# Altium footprint library myPCBLib.PcbLib: 113 footprints (part 2 of 8)
Each footprint in its own frame and in the unit in brackets; x right, y up, seen from the top. Pads: shape width x height; smd on the part's side, far side on the other; paste and mask are expansions set on the pad; w line width, h text height; cw(c..) or ccw(c..) is an arc to the next point about the centre after c.
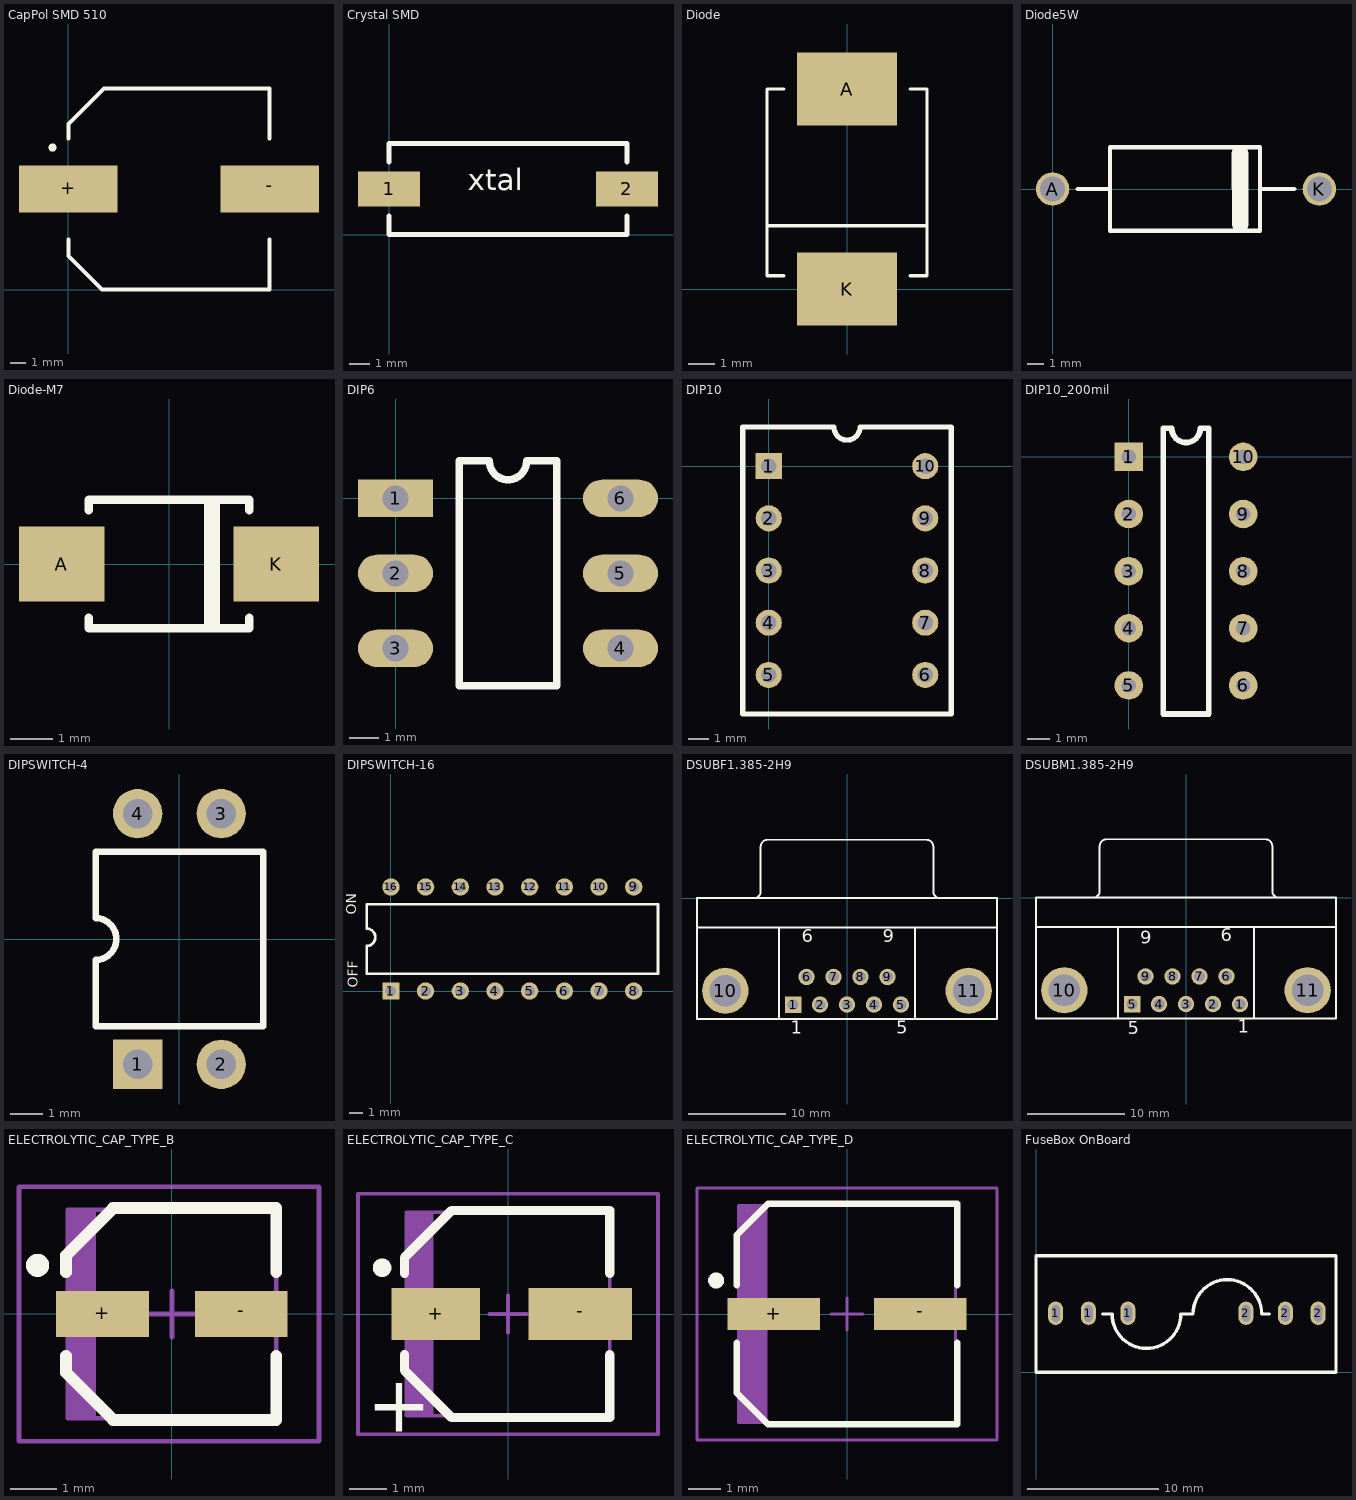
[diagram p1: the footprints below, top view; thin cyan lines are the x and y axes]

## CapPol SMD 510 [mil]
pads (2):
  rect 250x120 smd: +(0,255) -(510,255)
Top Overlay:
  circle w10: c-40,360 r5
  lines w10: 0,127.5 0,85 85,0 510,0 510,127.5 ; 0,382.5 0,420 90,510 510,510 510,382.5

## Crystal SMD [mm]
pads (2):
  rect 3x1.7 smd: 1(0,2.2) 2(11.5,2.2)
Top Overlay:
  lines w0.254: 0,0.9 0,0 11.5,0 11.5,0.9 ; 0,3.5 0,4.4 11.5,4.4 11.5,3.5
  text "xtal" at 3.8,1.8 h1.78

## Diode [mil]
pads (2):
  rect 150x110 smd: A(0,300) K(0,0)
Top Overlay:
  lines w1: -120,20 -120,300 ; 120,20 120,300
  lines w5: -120,95 120,95 ; -95,20 -120,20 -120,300 -95,300 ; 95,20 120,20 120,300 95,300

## Diode5W [mm]
pads (2):
  round 2 hole 1.5: A(0,0) K(16,0)
Top Overlay:
  lines w0.254: 1.5,0 3.437,0 ; 12.437,0 14.5,0 ; 3.437,0 3.437,-2.5 12.437,-2.5 12.437,2.5 3.437,2.5 3.437,0
  lines w1: 11.238,2.1 11.251,-2.1

## Diode-M7 [mil]
pads (2):
  rect 80x70 smd: A(-100,0) K(100,0)
Top Overlay:
  lines w7.87: -75,-60 75,-60 ; -75,60 75,60
  lines w8: -75,-60 -75,-50 ; -75,50 -75,60 ; 75,-60 75,-50 ; 75,50 75,60
  lines w15: 40,-55 40,55

## DIP6 [mil]
pads (6):
  rect 100x50 hole 35: 1(0,0)
  oval 100x50 hole 35: 2(0,-100) 3(0,-200) 4(300,-200) 5(300,-100) 6(300,0)
Top Overlay:
  lines w10: 85,-250 215,-250 215,50 175,50 cw(c150,50) 125,50 85,50 85,-250

## DIP10 [mil]
pads (10):
  rect 50x50 hole 30: 1(0,0)
  round 50 hole 30: 2(0,-100) 3(0,-200) 4(0,-300) 5(0,-400) 6(300,-400) 7(300,-300) 8(300,-200) 9(300,-100) 10(300,0)
Top Overlay:
  lines w10: -50,-475 350,-475 350,75 175,75 cw(c150,75) 125,75 -50,75 -50,-475

## DIP10_200mil [mil]
pads (10):
  rect 50x50 hole 25: 1(0,0)
  round 50 hole 25: 2(0,-100) 3(0,-200) 4(0,-300) 5(0,-400) 6(200,-400) 7(200,-300) 8(200,-200) 9(200,-100) 10(200,0)
Top Overlay:
  lines w10: 60,-450 140,-450 140,50 125,50 cw(c100,50) 75,50 60,50 60,-450

## DIPSWITCH-4 [mm]
pads (4):
  rect 1.5x1.5 hole 0.9: 1(-1.27,-3.81)
  round 1.5 hole 0.9: 2(1.27,-3.81) 3(1.27,3.81) 4(-1.27,3.81)
Top Overlay:
  lines w0.2: -2.55,-2.65 -2.55,-0.635 ccw(c-2.55,0) -2.55,0.635 -2.55,2.65 2.55,2.65 2.55,-2.65 -2.55,-2.65
3D body: height 6.3, standoff -4, extent -3.032,-4.8 3.048,4.8

## DIPSWITCH-16 [mil]
pads (16):
  rect 50x50 hole 30: 1(0,0)
  round 50 hole 30: 2(100,0) 3(200,0) 4(300,0) 5(400,0) 6(500,0) 7(600,0) 8(700,0) 9(700,300) 10(600,300) 11(500,300) 12(400,300) 13(300,300) 14(200,300) 15(100,300) 16(0,300)
Top Overlay:
  lines w7.87: -70,50 770,50 770,250 -70,250 -70,180 cw(c-70,155) -70,130 -70,50
  text "ON" at -90,220 h50
  text "OFF" at -85,10 h50
3D body: height 248.03, standoff -157.48, extent -70,-43.98 769.37,333.98

## DSUBF1.385-2H9 [mm]
pads (11):
  rect 1.69x1.69 hole 1.09: 1(-5.54,-10.92)
  round 1.69 hole 1.09: 2(-2.77,-10.92) 3(0,-10.92) 4(2.77,-10.92) 5(5.54,-10.92) 6(-4.155,-8.08) 7(-1.385,-8.08) 8(1.385,-8.08) 9(4.155,-8.08)
  round 4.76 hole 3.26: 10(-12.495,-9.5) 11(12.495,-9.5)
Top Overlay:
  lines w0.2: -15.4,-3 15.4,-3 ; -9.56,0.005 ccw(c-9.56,0.7) -8.865,0.7 -8.865,5.3 ; -8.86,5.305 cw(c-8.165,5.305) -8.165,6 8.165,6 cw(c8.165,5.305) 8.86,5.305 ; -7,-12.4 -7,-3 ; 7,-12.4 7,-3 ; 8.865,5.3 8.865,0.7 ccw(c9.56,0.7) 9.56,0.005 ; -15.4,-12.4 15.4,-12.4 15.4,0 -15.4,0 -15.4,-12.4
  text "6" at -4.655,-4.975 h2.29
  text "9" at 3.655,-4.975 h2.29
  text "5" at 5.04,-14.375 h2.29
  text "1" at -5.79,-14.375 h2.29
3D body: height 12.62, standoff -4.25, extent -15.443,-12.458 15.367,5.842

## DSUBM1.385-2H9 [mm]
pads (11):
  round 1.69 hole 1.09: 1(5.54,-10.92) 2(2.77,-10.92) 3(0,-10.92) 4(-2.77,-10.92) 6(4.155,-8.08) 7(1.385,-8.08) 8(-1.385,-8.08) 9(-4.155,-8.08)
  rect 1.69x1.69 hole 1.09: 5(-5.54,-10.92)
  round 4.76 hole 3.26: 10(-12.495,-9.5) 11(12.495,-9.5)
Top Overlay:
  lines w0.2: -15.4,-3 15.4,-3 ; -9.56,0.005 ccw(c-9.56,0.7) -8.865,0.7 -8.865,5.3 ; -8.86,5.305 cw(c-8.165,5.305) -8.165,6 8.165,6 cw(c8.165,5.305) 8.86,5.305 ; -7,-12.4 -7,-3 ; 7,-12.4 7,-3 ; 8.865,5.3 8.865,0.7 ccw(c9.56,0.7) 9.56,0.005 ; -15.4,-12.4 15.4,-12.4 15.4,0 -15.4,0 -15.4,-12.4
  text "6" at 3.556,-4.953 h2.29
  text "9" at -4.699,-5.207 h2.29
  text "5" at -5.969,-14.478 h2.29
  text "1" at 5.334,-14.351 h2.29
3D body: height 12.62, standoff -4.25, extent -15.494,-12.319 15.316,6.281

## ELECTROLYTIC_CAP_TYPE_B [mm]
pads (2):
  rect 2x1 smd: +(-1.5,0) -(1.5,0)
Top Overlay:
  circle w0.25: c-2.9,1.05 r0.125
  lines w0.254: -2.286,-0.9 -2.286,-1.27 -1.27,-2.286 2.25,-2.286 ; -2.286,0.9 -2.286,1.27 -1.27,2.286 2.25,2.286 2.25,0.9 ; 2.25,-2.25 2.25,-0.9
Mechanical 13:
  rectangle: -2.25,-2.25 -1.645,2.25
  lines w0.1: -2.25,-2.25 -2.25,2.25 2.25,2.25 2.25,-2.25 -2.25,-2.25
Mechanical 15:
  lines w0.1: -0.5,0 0.5,0 ; 0,-0.5 0,0.5 ; -3.302,-2.75 -3.302,2.75 3.175,2.75 3.175,-2.75 -3.302,-2.75
3D body: height 5.4, standoff 0, extent -2.3,-2.159 2.3,2.141

## ELECTROLYTIC_CAP_TYPE_C [mm]
pads (2):
  rect 2.4x1.4 smd: +(-1.95,0)
  rect 2.794x1.4 smd: -(1.95,0)
Top Overlay:
  circle w0.25: c-3.4,1.25 r0.125
  lines w0.254: -2.794,-1.1 -2.794,-1.524 -1.524,-2.794 2.75,-2.794 ; -2.794,1.1 -2.794,1.524 -1.524,2.794 2.75,2.794 ; 2.75,-2.75 2.75,-1.1 ; 2.75,1.1 2.75,2.75
  text "+" at -3.81,-3.175 h1.52
Mechanical 13:
  rectangle: -2.75,-2.75 -2.01,2.75
  lines w0.1: -2.75,-2.75 2.75,-2.75 2.75,2.75 -2.75,2.75 -2.75,-2.75
Mechanical 15:
  lines w0.1: -0.5,0 0.5,0 ; 0,-0.5 0,0.5 ; -4.05,-3.25 4.05,-3.25 4.05,3.25 -4.05,3.25 -4.05,-3.25
3D body: height 5.41, standoff 0, extent -3.048,-2.667 2.852,2.633

## ELECTROLYTIC_CAP_TYPE_D [mm]
pads (2):
  rect 2.9x1 smd: +(-2.3,0) -(2.3,0)
Top Overlay:
  circle w0.25: c-4.1,1.05 r0.125
  lines w0.2: -3.45,-0.9 -3.45,-2.475 -2.475,-3.45 3.45,-3.45 3.45,-0.9 ; -3.45,0.9 -3.45,2.475 -2.475,3.45 3.45,3.45 3.45,0.9
Mechanical 13:
  rectangle: -3.4,-3.4 -2.485,3.4
  lines w0.1: -3.4,-3.4 3.4,-3.4 3.4,3.4 -3.4,3.4 -3.4,-3.4
Mechanical 15:
  lines w0.1: -0.5,0 0.5,0 ; 0,-0.5 0,0.5 ; -4.7,-3.95 4.7,-3.95 4.7,3.95 -4.7,3.95 -4.7,-3.95
3D body: height 5.41, standoff -0.01, extent -3.525,-3.325 3.475,3.275

## FuseBox OnBoard [mil]
pads (6):
  oval 45x70 hole 25 slot 50 at 90 deg: 1(59.06,177.17) 1(157.48,177.17) 1(275.59,177.17) 2(629.92,177.17) 2(748.03,177.17) 2(846.46,177.17)
Top Overlay:
  lines w10: 200,175 228.35,175 ccw(c331.42,175) 434.5,175 471.01,175 cw(c574.09,175) 677.17,175 700,175 ; 0,0 0,350 900,350 900,0 0,0